# Altium footprint library rescap.PcbLib: 83 footprints (part 4 of 6)
Each footprint in its own frame and in the unit in brackets; x right, y up, seen from the top. Pads: shape width x height; smd on the part's side, far side on the other; paste and mask are expansions set on the pad; w line width, h text height; cw(c..) or ccw(c..) is an arc to the next point about the centre after c.
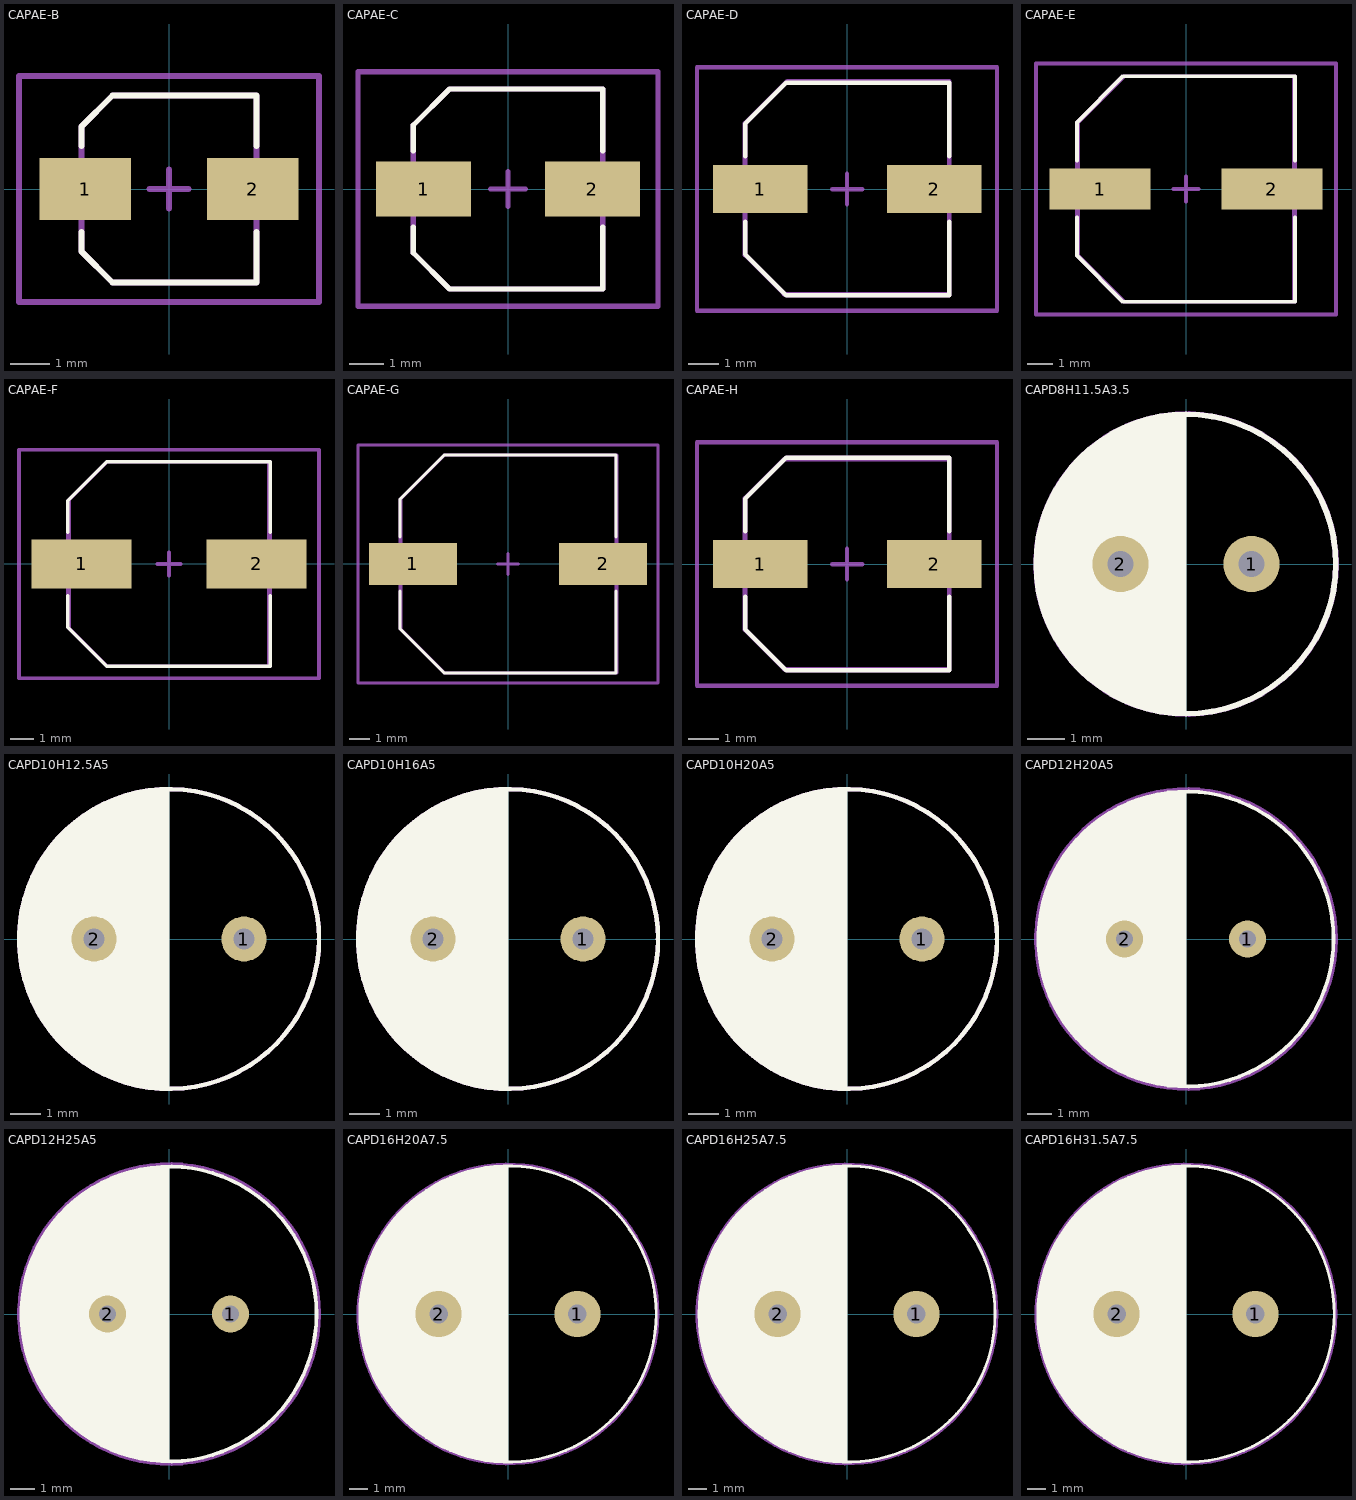
[diagram p3: the footprints below, top view; thin cyan lines are the x and y axes]

## CAPAE-B [mm] "Aluminum Electrolytic Capacitor, Body 4,40x4,80x5,70mm, IPC Medium Density"
height 5.7
pads (2):
  rect 2.35x1.6 smd: 1(-2.15,0) 2(2.15,0)
Top Overlay:
  lines w0.15: -2.25,-1.1 -2.25,-1.6 -1.45,-2.4 2.25,-2.4 2.25,-1.1 ; -2.25,1.1 -2.25,1.6 -1.45,2.4 2.25,2.4 2.25,1.1
Mechanical 15:
  lines w0.15: -0.5,0 0.5,0 ; 0,-0.5 0,0.5 ; -3.85,-2.9 3.85,-2.9 3.85,2.9 -3.85,2.9 -3.85,-2.9
Mechanical 29:
  lines w0.15: -1.4,-2.4 2.2,-2.4 ; -1.3,2.4 2.2,2.4 ; -2.25,-1.6 -2.25,1.6 -1.45,2.4 2.25,2.4 2.25,-2.4 -1.45,-2.4 -2.25,-1.6
  text ".Designator" at -2,-0.4 h1
3D body "CAPAE5548X57N.step": height 5.7, standoff 0, extent -2.75,-2.4 2.75,2.4

## CAPAE-C [mm] "Aluminum Electrolytic Capacitor, Body 5,40x5,80x5,70mm, IPC Medium Density"
height 5.7
pads (2):
  rect 2.75x1.6 smd: 1(-2.45,0) 2(2.45,0)
Top Overlay:
  lines w0.15: -2.75,-1.1 -2.75,-1.85 -1.7,-2.9 2.75,-2.9 2.75,-1.1 ; -2.75,1.1 -2.75,1.85 -1.7,2.9 2.75,2.9 2.75,1.1
Mechanical 15:
  lines w0.15: -0.5,0 0.5,0 ; 0,-0.5 0,0.5 ; -4.35,-3.4 4.35,-3.4 4.35,3.4 -4.35,3.4 -4.35,-3.4
Mechanical 29:
  lines w0.15: -2.75,-1.85 -2.75,1.85 -1.7,2.9 2.75,2.9 2.75,-2.9 -1.7,-2.9 -2.75,-1.85
  text ".Designator" at -2.6,-0.3 h1
3D body "CAPAE6558X57N.step": height 5.7, standoff 0, extent -3.25,-2.9 3.25,2.9

## CAPAE-D [mm] "Aluminum Electrolytic Capacitor, Body 6,70x7,10x5,70mm, IPC Medium Density"
height 5.7
pads (2):
  rect 3.15x1.6 smd: 1(-2.9,0) 2(2.9,0)
Top Overlay:
  lines w0.15: -3.4,-1.1 -3.4,-2.175 -2.025,-3.55 3.4,-3.55 3.4,-1.1 ; -3.4,1.1 -3.4,2.175 -2.025,3.55 3.4,3.55 3.4,1.1
Mechanical 15:
  lines w0.15: -0.5,0 0.5,0 ; 0,-0.5 0,0.5 ; -5,-4.05 -5,4.05 5,4.05 5,-4.05 -5,-4.05
Mechanical 29:
  lines w0.15: -3.4,-2.2 -2.1,-3.5 3.4,-3.5 3.4,3.6 -2,3.6 -3.4,2.2 -3.4,-2.2 ; -3.4,-2.175 -2.025,-3.55 3.4,-3.55 3.4,3.55 -2.025,3.55 -3.4,2.175 -3.4,-2.175
  text ".Designator" at -3.2,-0.3 h1
3D body "CAPAE7871X57N.step": height 5.7, standoff -0.85, extent -3.9,-3.55 3.9,3.55

## CAPAE-E [mm] "Aluminum Electrolytic Capacitor, Body 8,40x8,80x7,00mm, IPC Medium Density"
height 7
pads (2):
  rect 3.95x1.6 smd: 1(-3.35,0) 2(3.35,0)
Top Overlay:
  lines w0.15: -4.25,-1.1 -4.25,-2.6 -2.45,-4.4 4.25,-4.4 4.25,-1.1 ; -4.25,1.1 -4.25,2.6 -2.45,4.4 4.25,4.4 4.25,1.1
Mechanical 15:
  lines w0.15: -0.5,0 0.5,0 ; 0,-0.5 0,0.5 ; -5.85,-4.9 -5.85,4.9 5.85,4.9 5.85,-4.9 -5.85,-4.9
Mechanical 29:
  lines w0.15: -4.25,-2.6 -2.45,-4.4 4.25,-4.4 4.25,4.4 -2.45,4.4 -4.25,2.6 -4.25,-2.6 ; -4.2,-2.6 -4.2,2.6 -2.4,4.4 4.2,4.4 4.2,-4.4 -2.4,-4.4 -4.2,-2.6
  text ".Designator" at -3.4,-0.3 h1
3D body "CAPAE9588X70N.step": height 7, standoff -1.25, extent -4.75,-4.4 4.75,4.4

## CAPAE-F [mm] "Aluminum Electrolytic Capacitor, Body 8,40x8,60x11,00mm, IPC Medium Density"
height 11
pads (2):
  rect 4.2x2.05 smd: 1(-3.675,0) 2(3.675,0)
Top Overlay:
  lines w0.15: -4.25,-1.325 -4.25,-2.663 -2.612,-4.3 4.25,-4.3 4.25,-1.325 ; -4.25,1.325 -4.25,2.662 -2.612,4.3 4.25,4.3 4.25,1.325
Mechanical 15:
  lines w0.15: -0.5,0 0.5,0 ; 0,-0.5 0,0.5 ; -6.3,-4.8 -6.3,4.8 6.3,4.8 6.3,-4.8 -6.3,-4.8
Mechanical 29:
  lines w0.15: -4.25,-2.663 -2.612,-4.3 4.25,-4.3 4.25,4.3 -2.612,4.3 -4.25,2.662 -4.25,-2.663 ; -4.2,-2.7 -2.6,-4.3 4.2,-4.3 4.2,4.3 -2.6,4.3 -4.2,2.7 -4.2,-2.7
  text ".Designator" at -3.4,-0.3 h1
3D body "CAPAE10086X110N.step": height 11, standoff 0, extent -5,-4.3 5,4.3

## CAPAE-G [mm] "Aluminum Electrolytic Capacitor, Body 10,40x10,60x11,00mm, IPC Medium Density"
height 11
pads (2):
  rect 4.3x2.05 smd: 1(-4.625,0) 2(4.625,0)
Top Overlay:
  lines w0.15: -5.25,-1.325 -5.25,-3.163 -3.113,-5.3 5.25,-5.3 5.25,-1.325 ; -5.25,1.325 -5.25,3.162 -3.113,5.3 5.25,5.3 5.25,1.325
Mechanical 15:
  lines w0.15: -0.5,0 0.5,0 ; 0,-0.5 0,0.5 ; -7.3,-5.8 7.3,-5.8 7.3,5.8 -7.3,5.8 -7.3,-5.8
Mechanical 29:
  lines w0.15: -5.25,-3.163 -5.25,3.162 -3.113,5.3 5.25,5.3 5.25,-5.3 -3.113,-5.3 -5.25,-3.163 ; -5.2,-3.2 -5.2,3.2 -3.1,5.3 5.3,5.3 5.3,-5.3 -3.1,-5.3 -5.2,-3.2
  text ".Designator" at -3.4,-0.3 h1
3D body "CAPAE120106X110N.step": height 11, standoff 0, extent -6,-5.3 6,5.3

## CAPAE-H [mm] "Aluminum Electrolytic Capacitor, Body 6,70x7,10x8,00mm, IPC Medium Density"
height 8
pads (2):
  rect 3.15x1.6 smd: 1(-2.9,0) 2(2.9,0)
Top Overlay:
  lines w0.15: -3.4,-1.1 -3.4,-2.175 -2.025,-3.55 3.4,-3.55 3.4,-1.1 ; -3.4,1.1 -3.4,2.175 -2.025,3.55 3.4,3.55 3.4,1.1
Mechanical 15:
  lines w0.15: -0.5,0 0.5,0 ; 0,-0.5 0,0.5 ; -5,-4.05 5,-4.05 5,4.05 -5,4.05 -5,-4.05
Mechanical 29:
  lines w0.15: -3.4,-2.2 -2.1,-3.5 3.4,-3.5 3.4,3.5 -2.1,3.5 -3.4,2.2 -3.4,-2.2 ; -3.4,-2.175 -3.4,2.175 -2.025,3.55 3.4,3.55 3.4,-3.55 -2.025,-3.55 -3.4,-2.175
  text ".Designator" at -3.4,-0.3 h1
3D body "CAPAE7871X80N.step": height 8, standoff 0, extent -3.9,-3.55 3.9,3.55

## CAPD8H11.5A3.5 [mm]
height 11.5
pads (2):
  round 1.5 hole 0.7: 1(1.75,0) 2(-1.75,0)
Top Overlay:
  circle w0.15: c0,0 r4
  region: 0,-4 -0.262,-4 -0.782,-3.932 -1.289,-3.796 -1.773,-3.595 -2.227,-3.333 -2.643,-3.014 -3.014,-2.643 -3.333,-2.227 -3.595,-1.773 -3.796,-1.289 -3.932,-0.782 -4,-0.262 -4,0 -4,0.262 -3.932,0.782 -3.796,1.289 -3.595,1.773 -3.333,2.227 -3.014,2.643 -2.643,3.014 -2.227,3.333 -1.773,3.595 -1.289,3.796 -0.782,3.932 -0.262,4 0,4
Mechanical 29:
  circle w0.15: c0,0 r4.005
  lines w0.15: -2.5,-1 -2.5,1
  text ".Designator" at -2.1,-0.3 h1
3D body "CAP D8 H11.5 A3.5.STEP": height 12, standoff -2.3, extent -4.01,-4 4,4

## CAPD10H12.5A5 [mm]
height 12.5
pads (2):
  round 1.5 hole 0.7: 1(2.5,0) 2(-2.5,0)
Top Overlay:
  circle w0.15: c0,0 r5
  region: 0,-5 -0.328,-5 -0.978,-4.914 -1.611,-4.745 -2.216,-4.494 -2.784,-4.166 -3.304,-3.767 -3.767,-3.304 -4.166,-2.784 -4.494,-2.216 -4.745,-1.611 -4.914,-0.978 -5,-0.328 -5,0 -5,0.328 -4.914,0.978 -4.745,1.611 -4.494,2.216 -4.166,2.784 -3.767,3.304 -3.304,3.767 -2.784,4.166 -2.216,4.494 -1.611,4.745 -0.978,4.914 -0.328,5 0,5
Mechanical 29:
  circle w0.15: c0,0 r5
  lines w0.15: -3.7,-1 -3.7,0 -3.7,1
  text ".Designator" at -2.7,-0.4 h1
3D body: height 12.5, standoff 0, extent -4.999,-4.999 4.999,4.999

## CAPD10H16A5 [mm]
height 16
pads (2):
  round 1.5 hole 0.7: 1(2.5,0) 2(-2.5,0)
Top Overlay:
  circle w0.15: c0,0 r5
  region: 0,-5 -0.328,-5 -0.978,-4.914 -1.611,-4.745 -2.216,-4.494 -2.784,-4.166 -3.304,-3.767 -3.767,-3.304 -4.166,-2.784 -4.494,-2.216 -4.745,-1.611 -4.914,-0.978 -5,-0.328 -5,0 -5,0.328 -4.914,0.978 -4.745,1.611 -4.494,2.216 -4.166,2.784 -3.767,3.304 -3.304,3.767 -2.784,4.166 -2.216,4.494 -1.611,4.745 -0.978,4.914 -0.328,5 0,5
Mechanical 29:
  circle w0.15: c0,0 r5
  lines w0.15: -3.7,-1 -3.7,0 -3.7,1
  text ".Designator" at -2.1,-0.3 h1
3D body: height 16, standoff 0, extent -4.999,-4.999 4.999,4.999

## CAPD10H20A5 [mm]
height 20
pads (2):
  round 1.5 hole 0.7: 1(2.5,0) 2(-2.5,0)
Top Overlay:
  circle w0.15: c0,0 r5
  region: 0,-5 -0.328,-5 -0.978,-4.914 -1.611,-4.745 -2.216,-4.494 -2.784,-4.166 -3.304,-3.767 -3.767,-3.304 -4.166,-2.784 -4.494,-2.216 -4.745,-1.611 -4.914,-0.978 -5,-0.328 -5,0 -5,0.328 -4.914,0.978 -4.745,1.611 -4.494,2.216 -4.166,2.784 -3.767,3.304 -3.304,3.767 -2.784,4.166 -2.216,4.494 -1.611,4.745 -0.978,4.914 -0.328,5 0,5
Mechanical 29:
  circle w0.15: c0,0 r5
  lines w0.15: -3.7,-1 -3.7,0 -3.7,1
  text ".Designator" at -2.7,-0.2 h1
3D body: height 20, standoff 0, extent -4.999,-4.999 4.999,4.999

## CAPD12H20A5 [mm]
height 20
pads (2):
  round 1.5 hole 0.7: 1(2.5,0) 2(-2.5,0)
Top Overlay:
  circle w0.15: c0,0 r6
  region: 0,-6 -0.295,-6 -0.881,-5.942 -1.46,-5.827 -2.024,-5.656 -2.568,-5.43 -3.088,-5.153 -3.578,-4.825 -4.034,-4.451 -4.451,-4.034 -4.825,-3.579 -5.153,-3.088 -5.43,-2.568 -5.656,-2.024 -5.827,-1.46 -5.942,-0.881 -6,-0.295 -6,0 -6,0.295 -5.942,0.881 -5.827,1.46 -5.656,2.024 -5.43,2.568 -5.153,3.088 -4.825,3.578 -4.451,4.034 -4.034,4.451 -3.579,4.825 -3.088,5.153 -2.568,5.43 -2.024,5.656 -1.46,5.827 -0.881,5.942 -0.295,6 0,6
Mechanical 29:
  circle w0.15: c0,0 r6.1
  lines w0.15: -3.7,-1 -3.7,0 -3.7,1
  text ".Designator" at -2.8,-0.4 h1
3D body: height 20, standoff 0, extent -6,-6 6,6

## CAPD12H25A5 [mm]
height 25
pads (2):
  round 1.5 hole 0.7: 1(2.5,0) 2(-2.5,0)
Top Overlay:
  circle w0.15: c0,0 r6
  region: 0,-6 -0.295,-6 -0.881,-5.942 -1.46,-5.827 -2.024,-5.656 -2.568,-5.43 -3.088,-5.153 -3.578,-4.825 -4.034,-4.451 -4.451,-4.034 -4.825,-3.579 -5.153,-3.088 -5.43,-2.568 -5.656,-2.024 -5.827,-1.46 -5.942,-0.881 -6,-0.295 -6,0 -6,0.295 -5.942,0.881 -5.827,1.46 -5.656,2.024 -5.43,2.568 -5.153,3.088 -4.825,3.578 -4.451,4.034 -4.034,4.451 -3.579,4.825 -3.088,5.153 -2.568,5.43 -2.024,5.656 -1.46,5.827 -0.881,5.942 -0.295,6 0,6
Mechanical 29:
  circle w0.15: c0,0 r6.101
  lines w0.15: -3.7,-1 -3.7,0 -3.7,1
  text ".Designator" at -2.6,-0.3 h1
3D body: height 25, standoff 0, extent -6,-6 6,6

## CAPD16H20A7.5 [mm]
height 20
pads (2):
  round 2.5 hole 1: 1(3.75,0) 2(-3.75,0)
Top Overlay:
  circle w0.15: c0,0 r8
  region: 0,-8 -0.393,-8 -1.175,-7.923 -1.946,-7.77 -2.698,-7.541 -3.425,-7.241 -4.118,-6.87 -4.771,-6.433 -5.379,-5.935 -5.935,-5.379 -6.433,-4.771 -6.87,-4.118 -7.241,-3.425 -7.541,-2.698 -7.77,-1.946 -7.923,-1.175 -8,-0.393 -8,0 -8,0.393 -7.923,1.175 -7.77,1.946 -7.541,2.698 -7.241,3.425 -6.87,4.118 -6.433,4.771 -5.935,5.379 -5.379,5.935 -4.771,6.433 -4.118,6.87 -3.425,7.241 -2.698,7.541 -1.946,7.77 -1.175,7.923 -0.393,8 0,8
Mechanical 29:
  circle w0.15: c0,0 r8.1
  lines w0.15: -3.7,-1 -3.7,0 -3.7,1
  text ".Designator" at -2.2,-0.4 h1
3D body: height 20, standoff 0, extent -7.999,-7.999 7.999,7.999

## CAPD16H25A7.5 [mm]
height 25
pads (2):
  round 2.5 hole 1: 1(3.75,0) 2(-3.75,0)
Top Overlay:
  circle w0.15: c0,0 r8
  region: 0,-8 -0.393,-8 -1.175,-7.923 -1.946,-7.77 -2.698,-7.541 -3.425,-7.241 -4.118,-6.87 -4.771,-6.433 -5.379,-5.935 -5.935,-5.379 -6.433,-4.771 -6.87,-4.118 -7.241,-3.425 -7.541,-2.698 -7.77,-1.946 -7.923,-1.175 -8,-0.393 -8,0 -8,0.393 -7.923,1.175 -7.77,1.946 -7.541,2.698 -7.241,3.425 -6.87,4.118 -6.433,4.771 -5.935,5.379 -5.379,5.935 -4.771,6.433 -4.118,6.87 -3.425,7.241 -2.698,7.541 -1.946,7.77 -1.175,7.923 -0.393,8 0,8
Mechanical 29:
  circle w0.15: c0,0 r8.101
  lines w0.15: -3.7,-1 -3.7,0 -3.7,1
  text ".Designator" at -2.4,-0.3 h1
3D body: height 25, standoff 0, extent -7.999,-7.999 7.999,7.999

## CAPD16H31.5A7.5 [mm]
height 31.5
pads (2):
  round 2.5 hole 1: 1(3.75,0) 2(-3.75,0)
Top Overlay:
  circle w0.15: c0,0 r8
  region: 0,-8 -0.393,-8 -1.175,-7.923 -1.946,-7.77 -2.698,-7.541 -3.425,-7.241 -4.118,-6.87 -4.771,-6.433 -5.379,-5.935 -5.935,-5.379 -6.433,-4.771 -6.87,-4.118 -7.241,-3.425 -7.541,-2.698 -7.77,-1.946 -7.923,-1.175 -8,-0.393 -8,0 -8,0.393 -7.923,1.175 -7.77,1.946 -7.541,2.698 -7.241,3.425 -6.87,4.118 -6.433,4.771 -5.935,5.379 -5.379,5.935 -4.771,6.433 -4.118,6.87 -3.425,7.241 -2.698,7.541 -1.946,7.77 -1.175,7.923 -0.393,8 0,8
Mechanical 29:
  circle w0.15: c0,0 r8.1
  lines w0.15: -3.7,-1 -3.7,0 -3.7,1
  text ".Designator" at -2.3,-0.2 h1
3D body: height 31.5, standoff 0, extent -7.999,-7.999 7.999,7.999